# Altium footprint library kalios.PcbLib: 404 footprints (part 18 of 26)
Each footprint in its own frame and in the unit in brackets; x right, y up, seen from the top. Pads: shape width x height; smd on the part's side, far side on the other; paste and mask are expansions set on the pad; w line width, h text height; cw(c..) or ccw(c..) is an arc to the next point about the centre after c.
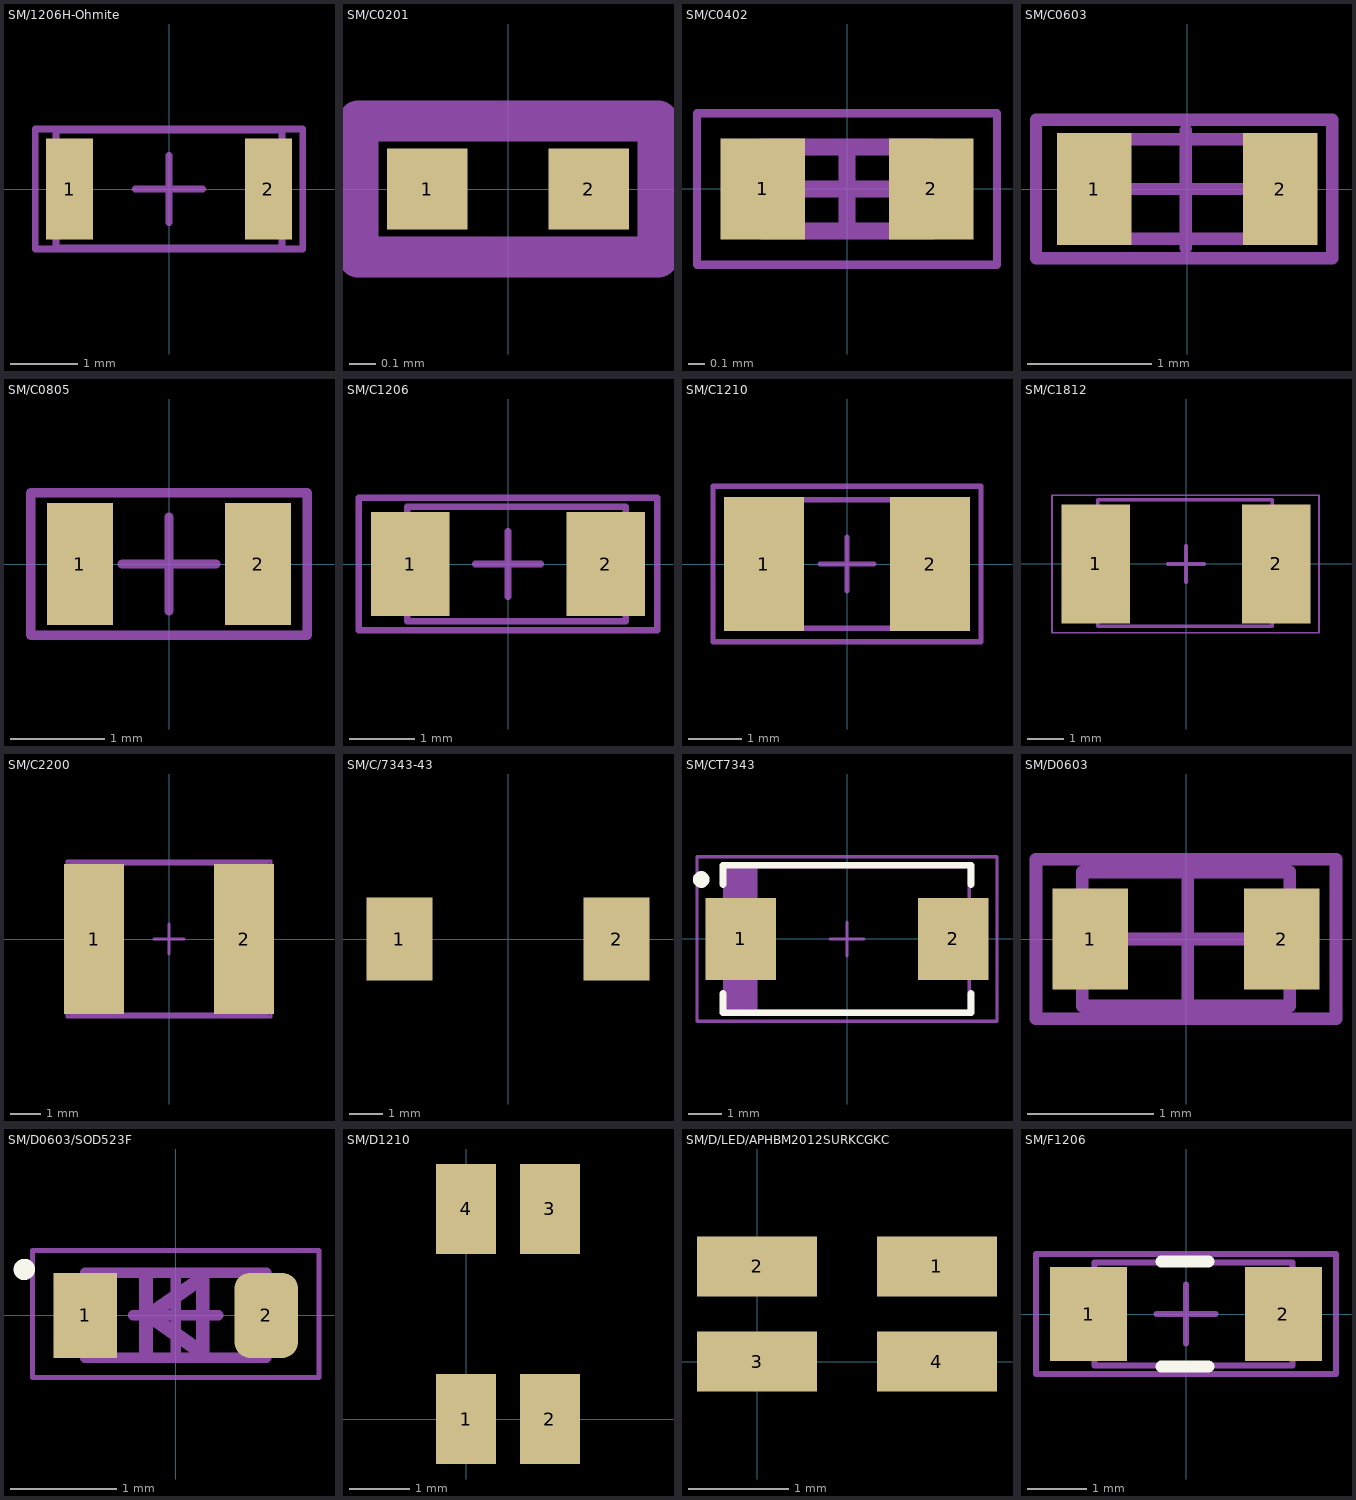
[diagram p17: the footprints below, top view; thin cyan lines are the x and y axes]

## SM/1206H-Ohmite [mm] "Chip Resistor, Body 3.2x1.6mm, IPC Low Density"
height 0.71
pads (2):
  rect 0.7x1.5 smd: 1(-1.473,0) 2(1.473,0)
Top 3D Body:
  lines w0.1: -1.675,-0.875 1.675,-0.875 1.675,0.875 -1.675,0.875 -1.675,-0.875
Top Courtyard:
  lines w0.1: -0.5,0 0.5,0 ; 0,-0.5 0,0.5 ; -1.981,-0.889 1.981,-0.889 1.981,0.889 -1.981,0.889 -1.981,-0.889
Top Designator:
  text ".Designator" at -7.618,-0.508 h1.52
3D body "OhmiteHV.STEP": height 0.61, standoff 0, extent -1.587,-0.775 1.588,0.775

## SM/C0201 [mm]
pads (2):
  rect 0.3x0.3 smd: 1(-0.3,0) 2(0.3,0)
Top Assembly (Mech11):
  lines w0.152: -0.559,-0.254 -0.559,0.254 0.559,0.254 0.559,-0.254 -0.559,-0.254
3D body "c0201c104k9pactu.stp": height 0.33, standoff 0, extent -0.315,-0.152 0.315,0.178

## SM/C0402 [mm] "Chip Resistor, 2-Leads, Body 1.00x0.50mm, IPC Medium Density"
height 0.6
pads (2):
  rect 0.5x0.6 smd: 1(-0.5,0) 2(0.5,0)
Top 3D Body:
  lines w0.1: -0.5,-0.25 0.5,-0.25 0.5,0.25 -0.5,0.25 -0.5,-0.25
Top Courtyard:
  lines w0.05: -0.889,-0.45 0.889,-0.45 0.889,0.45 -0.889,0.45 -0.889,-0.45
  lines w0.1: -0.25,0 0.25,0 ; 0,-0.25 0,0.25
Top Designator:
  text ".Designator" at -2.499,-0.167 h0.5
3D body "C0402.STEP": height 0.5, standoff 0, extent -0.5,-0.25 0.5,0.25

## SM/C0603 [mm] "Chip Capacitor, Body 1.6x0.8mm, IPC Low Density"
height 0.6
pads (2):
  rect 0.6x0.9 smd: 1(-0.75,0) 2(0.75,0)
Top 3D Body:
  lines w0.1: -0.851,-0.4 0.8,-0.4 0.8,0.4 -0.851,0.4 -0.851,-0.4
Top Courtyard:
  lines w0.1: -0.488,0 0.462,0 ; -0.013,-0.475 -0.013,0.475 ; -1.219,-0.559 -1.219,0.559 1.168,0.559 1.168,-0.559 -1.219,-0.559
Top Designator:
  text ".Designator" at -2.525,-0.167 h0.5
3D body "SM-C603.STEP": height 0.6, standoff 0, extent -0.825,-0.4 0.775,0.4

## SM/C0805 [mm] "Chip Resistor, Body 2.0x1.3mm, IPC Low Density"
height 0.65
pads (2):
  rect 0.7x1.3 smd: 1(-0.95,0) 2(0.95,0)
Top Courtyard:
  lines w0.1: -0.5,0 0.5,0 ; 0,-0.5 0,0.5 ; -1.473,-0.762 -1.473,0.762 1.473,0.762 1.473,-0.762 -1.473,-0.762
Top Designator:
  text ".Designator" at -7.618,-0.508 h1.52
3D body "User Library-cap_0805-1.STEP": height 1.2, standoff 0, extent -1,-0.59 1,0.61

## SM/C1206 [mm] "Chip Resistor, Body 3.2x1.6mm, IPC Low Density"
height 0.71
pads (2):
  rect 1.2x1.6 smd: 1(-1.5,0) 2(1.5,0)
Top 3D Body:
  lines w0.1: -1.548,-0.875 -1.548,0.875 1.802,0.875 1.802,-0.875 -1.548,-0.875
Top Courtyard:
  lines w0.1: -0.5,0 0.5,0 ; 0,-0.5 0,0.5 ; -2.286,-1.016 -2.286,1.016 2.286,1.016 2.286,-1.016 -2.286,-1.016
Top Designator:
  text ".Designator" at -4.998,-0.333 h1
3D body "CAP 1206.STEP": height 1.58, standoff -0.02, extent -1.6,-0.812 1.6,0.788

## SM/C1210 [mm] "Chip Resistor, Body 3.2x1.6mm, IPC Low Density"
height 0.71
pads (2):
  rect 1.5x2.5 smd: 1(-1.55,0) 2(1.55,0)
Top 3D Body:
  lines w0.1: -1.675,-1.2 -1.675,1.2 1.675,1.2 1.675,-1.2 -1.675,-1.2
Top Courtyard:
  lines w0.1: -0.5,0 0.5,0 ; 0,-0.5 0,0.5 ; -2.5,-1.45 -2.5,1.45 2.5,1.45 2.5,-1.45 -2.5,-1.45
Top Designator:
  text ".Designator" at -2.999,-0.2 h0.6
3D body "1210.STEP": height 2.5, standoff 0, extent -1.651,-1.245 1.549,1.255

## SM/C1812 [mm] "Chip Capacitor, 2-Leads, Body 7.00x3.15mm, IPC Medium Density"
height 0.6
pads (2):
  rect 1.9x3.3 smd: 1(-2.5,0) 2(2.5,0)
Top 3D Body:
  lines w0.1: -2.438,-1.727 -2.438,1.778 2.388,1.778 2.388,-1.727 -2.438,-1.727
Top Courtyard:
  lines w0.05: -3.708,-1.9 -3.708,1.9 3.683,1.9 3.683,-1.9 -3.708,-1.9
  lines w0.1: -0.5,0 0.5,0 ; 0,-0.5 0,0.5
3D body "c1812c102kgractu.stp": height 1.54, standoff -0.01, extent -2.425,-1.727 2.375,1.773

## SM/C2200 [mm] "Chip Resistor, Body 3.2x1.6mm, IPC Low Density"
height 0.71
pads (2):
  rect 2x5 smd: 1(-2.5,0) 2(2.5,0)
Top 3D Body:
  lines w0.1: -3.3,-2.5 3.3,-2.5 3.3,2.5 -3.3,2.5 -3.3,-2.5
Top Courtyard:
  lines w0.1: -0.5,0 0.5,0 ; 0,-0.5 0,0.5 ; -3.4,-2.6 3.4,-2.6 3.4,2.6 -3.4,2.6 -3.4,-2.6
Top Designator:
  text ".Designator" at -7.618,-0.508 h1.52
3D body "User Library-CAPC5750X23.STEP": height 2.3, standoff 0, extent -2.901,-2.495 2.799,2.505

## SM/C/7343-43 [mm]
pads (2):
  rect 2x2.5 smd: 1(-3.289,0) 2(3.289,0)
Top Designator:
  text ".Designator" at -7.618,-0.508 h1.52
3D body "7343-43 (E).STEP": height 4.1, standoff 0, extent -3.688,-2.15 3.612,2.15

## SM/CT7343 [mm] "Molded Capacitor, 2-Leads, Body 7.3x4.3mm, IPC Medium Density"
height 2.8
pads (2):
  rect 2.1x2.45 smd: 1(-3.175,0) 2(3.175,0)
Top Overlay:
  circle w0.25: c-4.35,1.775 r0.125
  lines w0.2: -3.7,-1.625 -3.7,-2.2 3.7,-2.2 3.7,-1.625 ; -3.7,1.625 -3.7,2.2 3.7,2.2 3.7,1.625
Top 3D Body:
  rectangle: -3.65,-2.15 -2.668,2.15
  lines w0.1: -3.65,-2.15 -3.65,2.15 3.65,2.15 3.65,-2.15 -3.65,-2.15
Top Courtyard:
  lines w0.1: -0.5,0 0.5,0 ; 0,-0.5 0,0.5 ; -4.475,-2.45 -4.475,2.45 4.475,2.45 4.475,-2.45 -4.475,-2.45
Top Designator:
  text ".Designator" at -7.655,-0.508 h1.52
3D body "User Library-tantulum cap 7343.STEP": height 2.2, standoff -0.03, extent -3.65,-2.108 3.65,2.192

## SM/D0603 [mm] "Chip Resistor, Body 1.6x0.8mm, IPC Low Density"
height 0.6
pads (2):
  rect 0.6x0.8 smd: 1(-0.762,0) 2(0.762,0)
Top 3D Body:
  lines w0.1: -0.826,-0.533 -0.826,0.533 0.826,0.533 0.826,-0.533 -0.826,-0.533
Top Courtyard:
  lines w0.1: -0.462,0 0.488,0 ; 0.013,-0.475 0.013,0.475 ; -1.194,-0.635 1.194,-0.635 1.194,0.635 -1.194,0.635 -1.194,-0.635
Top Designator:
  text ".Designator" at -7.618,-0.508 h1.52
3D body "CDSU101A.STEP": height 0.85, standoff 0, extent -0.925,-0.508 0.875,0.492

## SM/D0603/SOD523F [mm] "Chip Diode, 2-Leads, Body 1.70x0.80mm, IPC Medium Density"
height 0.6
pads (2):
  rect 0.6x0.8 smd: 1(-0.85,0)
  rrect50% 0.6x0.8 smd: 2(0.85,0)
Top Overlay:
  circle w0.1: c-1.422,0.432 r0.05
Top Assembly (Mech11):
  lines w0.13: -0.279,-0.356 -0.279,0.356 ; -0.254,0 0.254,0.356 0.254,-0.356 -0.254,0
Top 3D Body:
  lines w0.1: -0.85,-0.4 -0.85,0.4 0.85,0.4 0.85,-0.4 -0.85,-0.4
Top Courtyard:
  lines w0.05: -1.346,-0.584 -1.346,0.61 1.346,0.61 1.346,-0.584 -1.346,-0.584
  lines w0.1: -0.4,0 0.4,0 ; 0,-0.4 0,0.4
3D body "0603-SOD-523F.STEP": height 0.85, standoff -0.01, extent -0.901,-0.508 0.901,0.492

## SM/D1210 [mm]
pads (4):
  rect 1x1.5 smd: 1(0,0) 2(1.4,0) 3(1.4,3.5) 4(0,3.5)
Top Designator:
  text ".Designator" at -6.881,1.242 h1.52
3D body "1210 2 color LED.STEP": height 1.09, standoff 0, extent -0.609,0.165 2.083,3.34

## SM/D/LED/APHBM2012SURKCGKC [mm]
pads (4):
  rect 1.2x0.6 smd: 1(1.8,0.95) 2(0,0.95) 3(0,0) 4(1.8,0)
Top Designator:
  text ".Designator" at -6.718,-0.033 h1.52
3D body "led.STEP": height 0.44, standoff -0.01, extent -0.136,-0.168 1.864,1.082

## SM/F1206 [mm] "Chip Fuse, Body 3.2x1.8mm, IPC Low Density"
height 0.71
pads (2):
  rect 1.3x1.6 smd: 1(-1.651,0) 2(1.651,0)
Top Overlay:
  lines w0.2: -0.419,-0.889 0.381,-0.889 ; -0.419,0.889 0.381,0.889
Top 3D Body:
  lines w0.1: -1.548,-0.875 -1.548,0.875 1.802,0.875 1.802,-0.875 -1.548,-0.875
Top Courtyard:
  lines w0.1: -0.5,0 0.5,0 ; 0,-0.5 0,0.5 ; -2.54,-1.016 -2.54,1.016 2.54,1.016 2.54,-1.016 -2.54,-1.016
Top Designator:
  text ".Designator" at -7.618,-0.508 h1.52
3D body "283-2797-2-ND.STEP": height 0.9, standoff -0.1, extent -1.649,-0.936 1.751,0.864